# Altium footprint library PcbLib1.PcbLib: 81 footprints (part 3 of 6)
Each footprint in its own frame and in the unit in brackets; x right, y up, seen from the top. Pads: shape width x height; smd on the part's side, far side on the other; paste and mask are expansions set on the pad; w line width, h text height; cw(c..) or ccw(c..) is an arc to the next point about the centre after c.
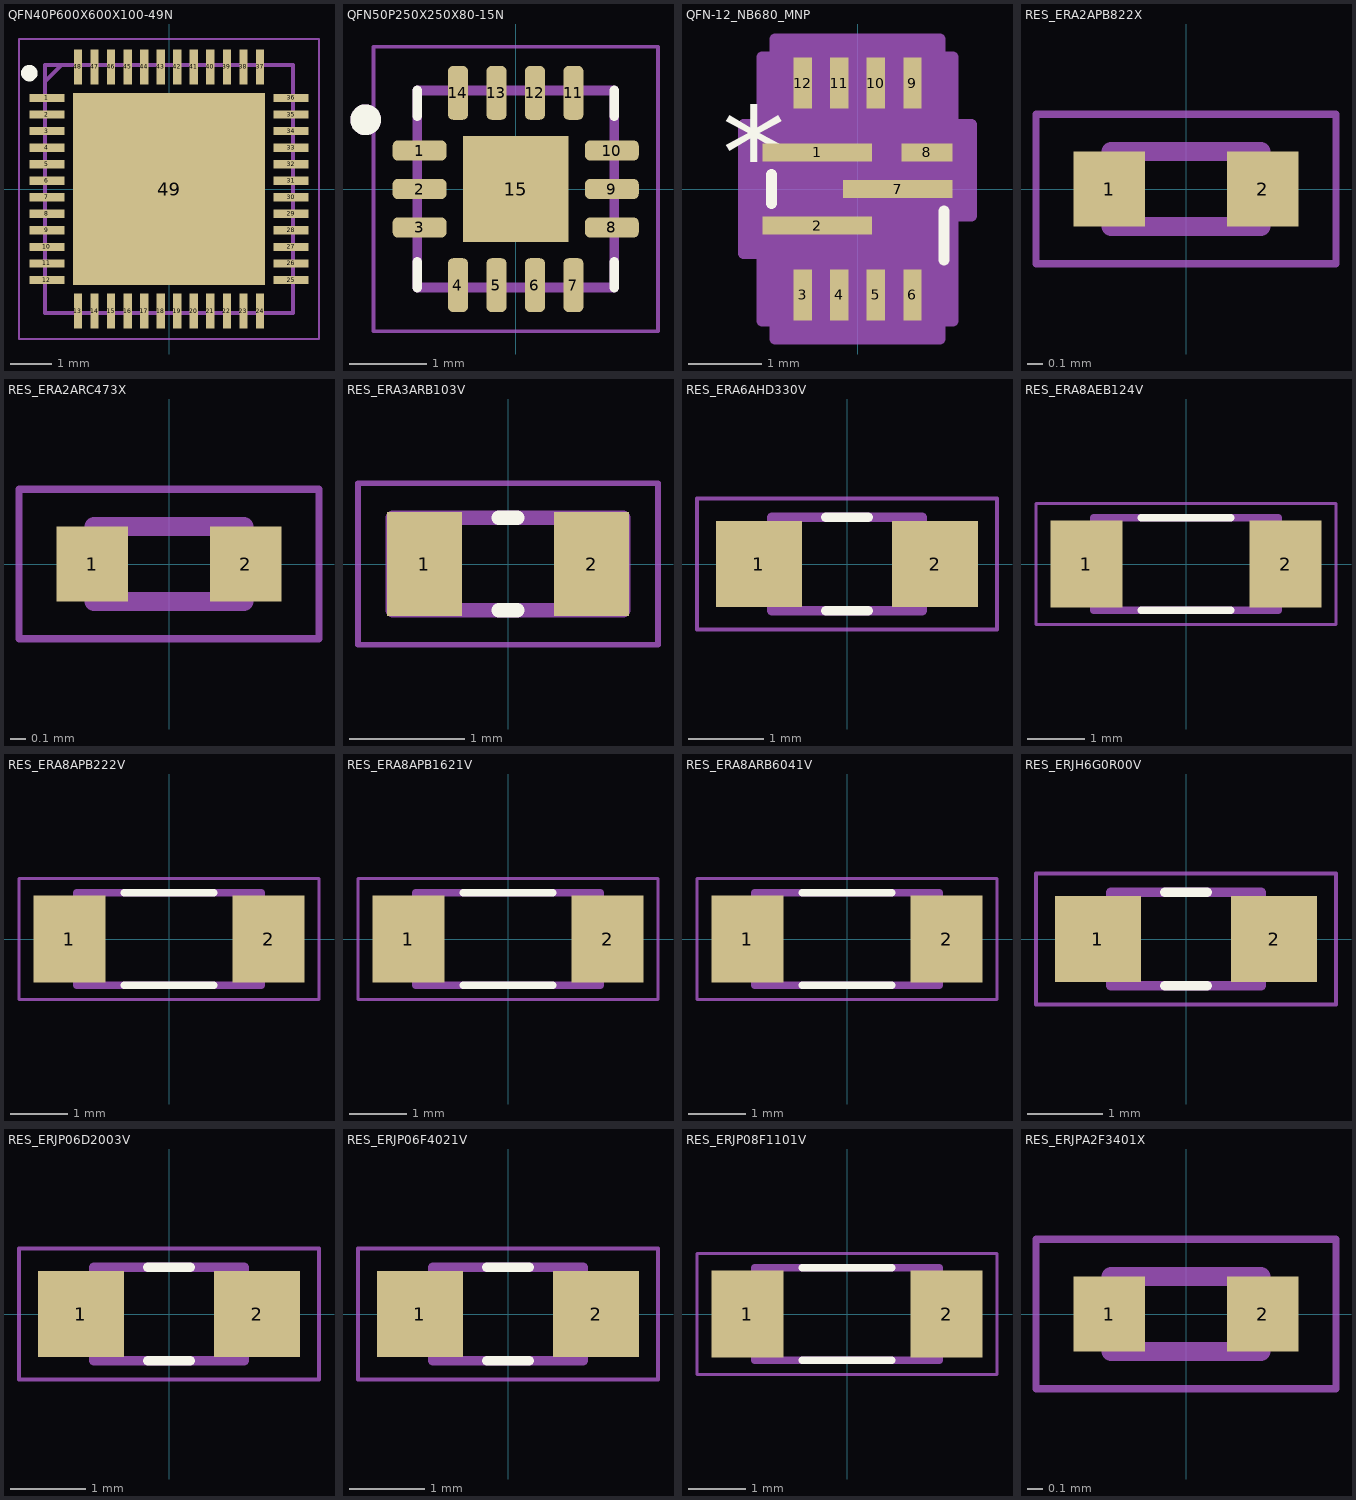
[diagram p2: the footprints below, top view; thin cyan lines are the x and y axes]

## QFN40P600X600X100-49N [mm]
pads (49):
  rect 0.85x0.2 smd: 1(-2.95,2.2) 2(-2.95,1.8) 3(-2.95,1.4) 4(-2.95,1) 5(-2.95,0.6) 6(-2.95,0.2) 7(-2.95,-0.2) 8(-2.95,-0.6) 9(-2.95,-1) 10(-2.95,-1.4) 11(-2.95,-1.8) 12(-2.95,-2.2) 25(2.95,-2.2) 26(2.95,-1.8) 27(2.95,-1.4) 28(2.95,-1) 29(2.95,-0.6) 30(2.95,-0.2) 31(2.95,0.2) 32(2.95,0.6) 33(2.95,1) 34(2.95,1.4) 35(2.95,1.8) 36(2.95,2.2)
  rect 0.2x0.85 smd: 13(-2.2,-2.95) 14(-1.8,-2.95) 15(-1.4,-2.95) 16(-1,-2.95) 17(-0.6,-2.95) 18(-0.2,-2.95) 19(0.2,-2.95) 20(0.6,-2.95) 21(1,-2.95) 22(1.4,-2.95) 23(1.8,-2.95) 24(2.2,-2.95) 37(2.2,2.95) 38(1.8,2.95) 39(1.4,2.95) 40(1,2.95) 41(0.6,2.95) 42(0.2,2.95) 43(-0.2,2.95) 44(-0.6,2.95) 45(-1,2.95) 46(-1.4,2.95) 47(-1.8,2.95) 48(-2.2,2.95)
  rect 4.65x4.65 smd: 49(0,0)
Top Overlay:
  circle w0.2: c-3.375,2.8 r0.1
Mechanical 15:
  lines w0.1: -3,2.6 -2.6,3 ; -3,-3 -3,3 3,3 3,-3 -3,-3
Mechanical 20:
  lines w0.05: -3.625,-3.625 -3.625,3.625 3.625,3.625 3.625,-3.625 -3.625,-3.625
3D body "RTL8211E-VB-CG.stp": height 1, standoff 0, extent -3.05,-3.05 3.05,3.05

## QFN50P250X250X80-15N [mm]
pads (15):
  rrect50% 0.7x0.26 smd: 1(-1.25,0.5) 2(-1.25,0) 3(-1.25,-0.5) 8(1.25,-0.5) 9(1.25,0) 10(1.25,0.5)
  rrect50% 0.26x0.7 smd: 4(-0.75,-1.25) 5(-0.25,-1.25) 6(0.25,-1.25) 7(0.75,-1.25) 11(0.75,1.25) 12(0.25,1.25) 13(-0.25,1.25) 14(-0.75,1.25)
  rect 1.375x1.375 smd paste-0.199: 15(0,0)
Top Overlay:
  circle w0.2: c-1.95,0.9 r0.1
  lines w0.127: -1.28,-1.28 -1.28,-0.95 ; -1.28,0.95 -1.28,1.28 ; 1.28,-1.28 1.28,-0.95 ; 1.28,0.95 1.28,1.28
Mechanical 13:
  circle w0.2: c-1.95,0.9 r0.1
  lines w0.127: -1.28,-1.28 1.28,-1.28 1.28,1.28 -1.28,1.28 -1.28,-1.28
Mechanical 15:
  lines w0.05: -1.85,-1.85 1.85,-1.85 1.85,1.85 -1.85,1.85 -1.85,-1.85
3D body "step_temp.STEP": height 0.8, standoff 0, extent -1.28,-1.28 1.28,1.28

## QFN-12_NB680_MNP [mm]
pads (12):
  rect 1.5x0.25 smd paste+0 mask+0: 1(-0.55,0.5) 2(-0.55,-0.5) 7(0.55,0)
  rect 0.25x0.7 smd paste+0 mask+0: 3(-0.75,-1.45) 4(-0.25,-1.45) 5(0.25,-1.45) 6(0.75,-1.45) 9(0.75,1.45) 10(0.25,1.45) 11(-0.25,1.45) 12(-0.75,1.45)
  rect 0.7x0.25 smd paste+0 mask+0: 8(0.95,0.5)
Top Overlay:
  lines w0.152: -1.181,-0.197 -1.181,0.197 ; 1.181,-0.969 1.181,-0.303
  text "*" at -1.853,-0.135 h1.27
  text ".Designator" at -1.651,-3.429 h1.27
Mechanical 13:
  lines w0.025: -1.054,0.279 0.216,1.549 ; -1.054,-1.549 1.054,-1.549 1.054,1.549 -1.054,1.549 -1.054,-1.549
  text ".Designator" at -3.492,-0.635 h1.27
  text "*" at 0.118,-0.135 h1.27
Mechanical 15:
  region: -1.308,0.879 -1.308,1.803 -1.129,1.803 -1.129,2.054 1.129,2.054 1.129,1.803 1.308,1.803 1.308,0.879 1.562,0.879 1.562,-0.371 1.308,-0.371 1.308,-1.803 1.129,-1.803 1.129,-2.054 -1.129,-2.054 -1.129,-1.803 -1.308,-1.803 -1.308,-0.879 -1.562,-0.879 -1.562,0.879
  lines w0.152: -1.562,-0.879 -1.562,0.879 -1.308,0.879 -1.308,1.803 -1.129,1.803 -1.129,2.054 1.129,2.054 1.129,1.803 1.308,1.803 1.308,0.879 1.562,0.879 1.562,-0.371 1.308,-0.371 1.308,-1.803 1.129,-1.803 1.129,-2.054 -1.129,-2.054 -1.129,-1.803 -1.308,-1.803 -1.308,-0.879 -1.562,-0.879
3D body "MP8756 (QFN-12, 2x3).step": height 0.9, standoff 0, extent -1.111,-1.5 0.889,1.5

## RES_ERA2APB822X [mm]
height 0.35
pads (2):
  rect 0.475x0.5 smd: 1(-0.512,0) 2(0.512,0)
Mechanical 13:
  lines w0.127: -0.5,-0.25 -0.5,0.25 0.5,0.25 0.5,-0.25 -0.5,-0.25
Mechanical 15:
  lines w0.05: -1,-0.5 -1,0.5 1,0.5 1,-0.5 -1,-0.5
3D body "step_temp.STEP": height 0.35, standoff 0, extent -0.5,-0.25 0.5,0.25

## RES_ERA2ARC473X [mm]
pads (2):
  rect 0.475x0.5 smd: 1(-0.512,0) 2(0.512,0)
Mechanical 13:
  lines w0.127: -0.5,-0.25 -0.5,0.25 0.5,0.25 0.5,-0.25 -0.5,-0.25
Mechanical 15:
  lines w0.05: -1,-0.5 -1,0.5 1,0.5 1,-0.5 -1,-0.5
3D body "ERA2ARC473X.STEP": height 0.35, standoff 0, extent -0.5,-0.25 0.5,0.25

## RES_ERA3ARB103V [mm]
pads (2):
  rect 0.65x0.9 smd: 1(-0.725,0) 2(0.725,0)
Top Overlay:
  lines w0.127: -0.08,-0.4 0.08,-0.4 ; -0.08,0.4 0.08,0.4
Mechanical 13:
  lines w0.127: -1,-0.4 1,-0.4 1,0.4 -1,0.4 -1,-0.4
Mechanical 15:
  lines w0.05: -1.3,-0.7 1.3,-0.7 1.3,0.7 -1.3,0.7 -1.3,-0.7
3D body "ERA-3ARB103V.STEP": height 0.45, standoff 0, extent -0.8,-0.4 0.8,0.4

## RES_ERA6AHD330V [mm]
pads (2):
  rect 1.15x1.15 smd: 1(-1.175,0) 2(1.175,0)
Top Overlay:
  lines w0.127: -0.28,-0.625 0.28,-0.625 ; -0.28,0.625 0.28,0.625
Mechanical 13:
  lines w0.127: -1,-0.625 -1,0.625 1,0.625 1,-0.625 -1,-0.625
Mechanical 15:
  lines w0.05: -2,-0.875 -2,0.875 2,0.875 2,-0.875 -2,-0.875
3D body "ERA6AHD330V.STEP": height 0.6, standoff 0, extent -1,-0.625 1,0.625

## RES_ERA8AEB124V [mm]
pads (2):
  rect 1.25x1.5 smd: 1(-1.725,0) 2(1.725,0)
Top Overlay:
  lines w0.127: -0.78,-0.8 0.78,-0.8 ; -0.78,0.8 0.78,0.8
Mechanical 13:
  lines w0.127: -1.6,-0.8 -1.6,0.8 1.6,0.8 1.6,-0.8 -1.6,-0.8
Mechanical 15:
  lines w0.05: -2.6,-1.05 -2.6,1.05 2.6,1.05 2.6,-1.05 -2.6,-1.05
3D body "ERA8AEB124V.STEP": height 0.6, standoff 0, extent -1.6,-0.8 1.6,0.8

## RES_ERA8APB222V [mm]
pads (2):
  rect 1.25x1.5 smd: 1(-1.725,0) 2(1.725,0)
Top Overlay:
  lines w0.127: -0.78,-0.8 0.78,-0.8 ; -0.78,0.8 0.78,0.8
Mechanical 13:
  lines w0.127: -1.6,-0.8 1.6,-0.8 1.6,0.8 -1.6,0.8 -1.6,-0.8
Mechanical 15:
  lines w0.05: -2.6,-1.05 2.6,-1.05 2.6,1.05 -2.6,1.05 -2.6,-1.05
3D body "ERA8APB222V.STEP": height 0.6, standoff 0, extent -1.6,-0.8 1.6,0.8

## RES_ERA8APB1621V [mm]
pads (2):
  rect 1.25x1.5 smd: 1(-1.725,0) 2(1.725,0)
Top Overlay:
  lines w0.127: -0.78,-0.8 0.78,-0.8 ; -0.78,0.8 0.78,0.8
Mechanical 13:
  lines w0.127: -1.6,-0.8 1.6,-0.8 1.6,0.8 -1.6,0.8 -1.6,-0.8
Mechanical 15:
  lines w0.05: -2.6,-1.05 2.6,-1.05 2.6,1.05 -2.6,1.05 -2.6,-1.05
3D body "ERA8APB1621V.STEP": height 0.6, standoff 0, extent -1.6,-0.8 1.6,0.8

## RES_ERA8ARB6041V [mm]
pads (2):
  rect 1.25x1.5 smd: 1(-1.725,0) 2(1.725,0)
Top Overlay:
  lines w0.127: -0.78,-0.8 0.78,-0.8 ; -0.78,0.8 0.78,0.8
Mechanical 13:
  lines w0.127: -1.6,-0.8 -1.6,0.8 1.6,0.8 1.6,-0.8 -1.6,-0.8
Mechanical 15:
  lines w0.05: -2.6,-1.05 -2.6,1.05 2.6,1.05 2.6,-1.05 -2.6,-1.05
3D body "ERA-8ARB6041V.STEP": height 0.6, standoff 0, extent -1.6,-0.8 1.6,0.8

## RES_ERJH6G0R00V [mm]
pads (2):
  rect 1.15x1.15 smd: 1(-1.175,0) 2(1.175,0)
Top Overlay:
  lines w0.127: -0.28,-0.625 0.28,-0.625 ; -0.28,0.625 0.28,0.625
Mechanical 13:
  lines w0.127: -1,-0.625 1,-0.625 1,0.625 -1,0.625 -1,-0.625
Mechanical 15:
  lines w0.05: -2,-0.875 2,-0.875 2,0.875 -2,0.875 -2,-0.875
3D body "ERJH6G0R00V.STEP": height 0.6, standoff 0, extent -1,-0.625 1,0.625

## RES_ERJP06D2003V [mm]
pads (2):
  rect 1.15x1.15 smd: 1(-1.175,0) 2(1.175,0)
Top Overlay:
  lines w0.127: -0.28,-0.625 0.28,-0.625 ; -0.28,0.625 0.28,0.625
Mechanical 13:
  lines w0.127: -1,-0.625 -1,0.625 1,0.625 1,-0.625 -1,-0.625
Mechanical 15:
  lines w0.05: -2,-0.875 -2,0.875 2,0.875 2,-0.875 -2,-0.875
3D body "ERJP06D2003V.STEP": height 0.6, standoff 0, extent -1,-0.625 1,0.625

## RES_ERJP06F4021V [mm]
pads (2):
  rect 1.15x1.15 smd: 1(-1.175,0) 2(1.175,0)
Top Overlay:
  lines w0.127: -0.28,-0.625 0.28,-0.625 ; -0.28,0.625 0.28,0.625
Mechanical 13:
  lines w0.127: -1,-0.625 1,-0.625 1,0.625 -1,0.625 -1,-0.625
Mechanical 15:
  lines w0.05: -2,-0.875 2,-0.875 2,0.875 -2,0.875 -2,-0.875
3D body "ERJP06F4021V.STEP": height 0.6, standoff 0, extent -1,-0.625 1,0.625

## RES_ERJP08F1101V [mm]
pads (2):
  rect 1.25x1.5 smd: 1(-1.725,0) 2(1.725,0)
Top Overlay:
  lines w0.127: -0.78,-0.8 0.78,-0.8 ; -0.78,0.8 0.78,0.8
Mechanical 13:
  lines w0.127: -1.6,-0.8 -1.6,0.8 1.6,0.8 1.6,-0.8 -1.6,-0.8
Mechanical 15:
  lines w0.05: -2.6,-1.05 -2.6,1.05 2.6,1.05 2.6,-1.05 -2.6,-1.05
3D body "ERJP08F1101V.STEP": height 0.6, standoff 0, extent -1.6,-0.8 1.6,0.8

## RES_ERJPA2F3401X [mm]
pads (2):
  rect 0.475x0.5 smd: 1(-0.512,0) 2(0.512,0)
Mechanical 13:
  lines w0.127: -0.5,-0.25 0.5,-0.25 0.5,0.25 -0.5,0.25 -0.5,-0.25
Mechanical 15:
  lines w0.05: -1,-0.5 1,-0.5 1,0.5 -1,0.5 -1,-0.5
3D body "ERJ-PA2F3401X.STEP": height 0.35, standoff 0, extent -0.5,-0.25 0.5,0.25